# Altium footprint library WE Inductors.PcbLib: 131 footprints (part 7 of 9)
Each footprint in its own frame and in the unit in brackets; x right, y up, seen from the top. Pads: shape width x height; smd on the part's side, far side on the other; paste and mask are expansions set on the pad; w line width, h text height; cw(c..) or ccw(c..) is an arc to the next point about the centre after c.
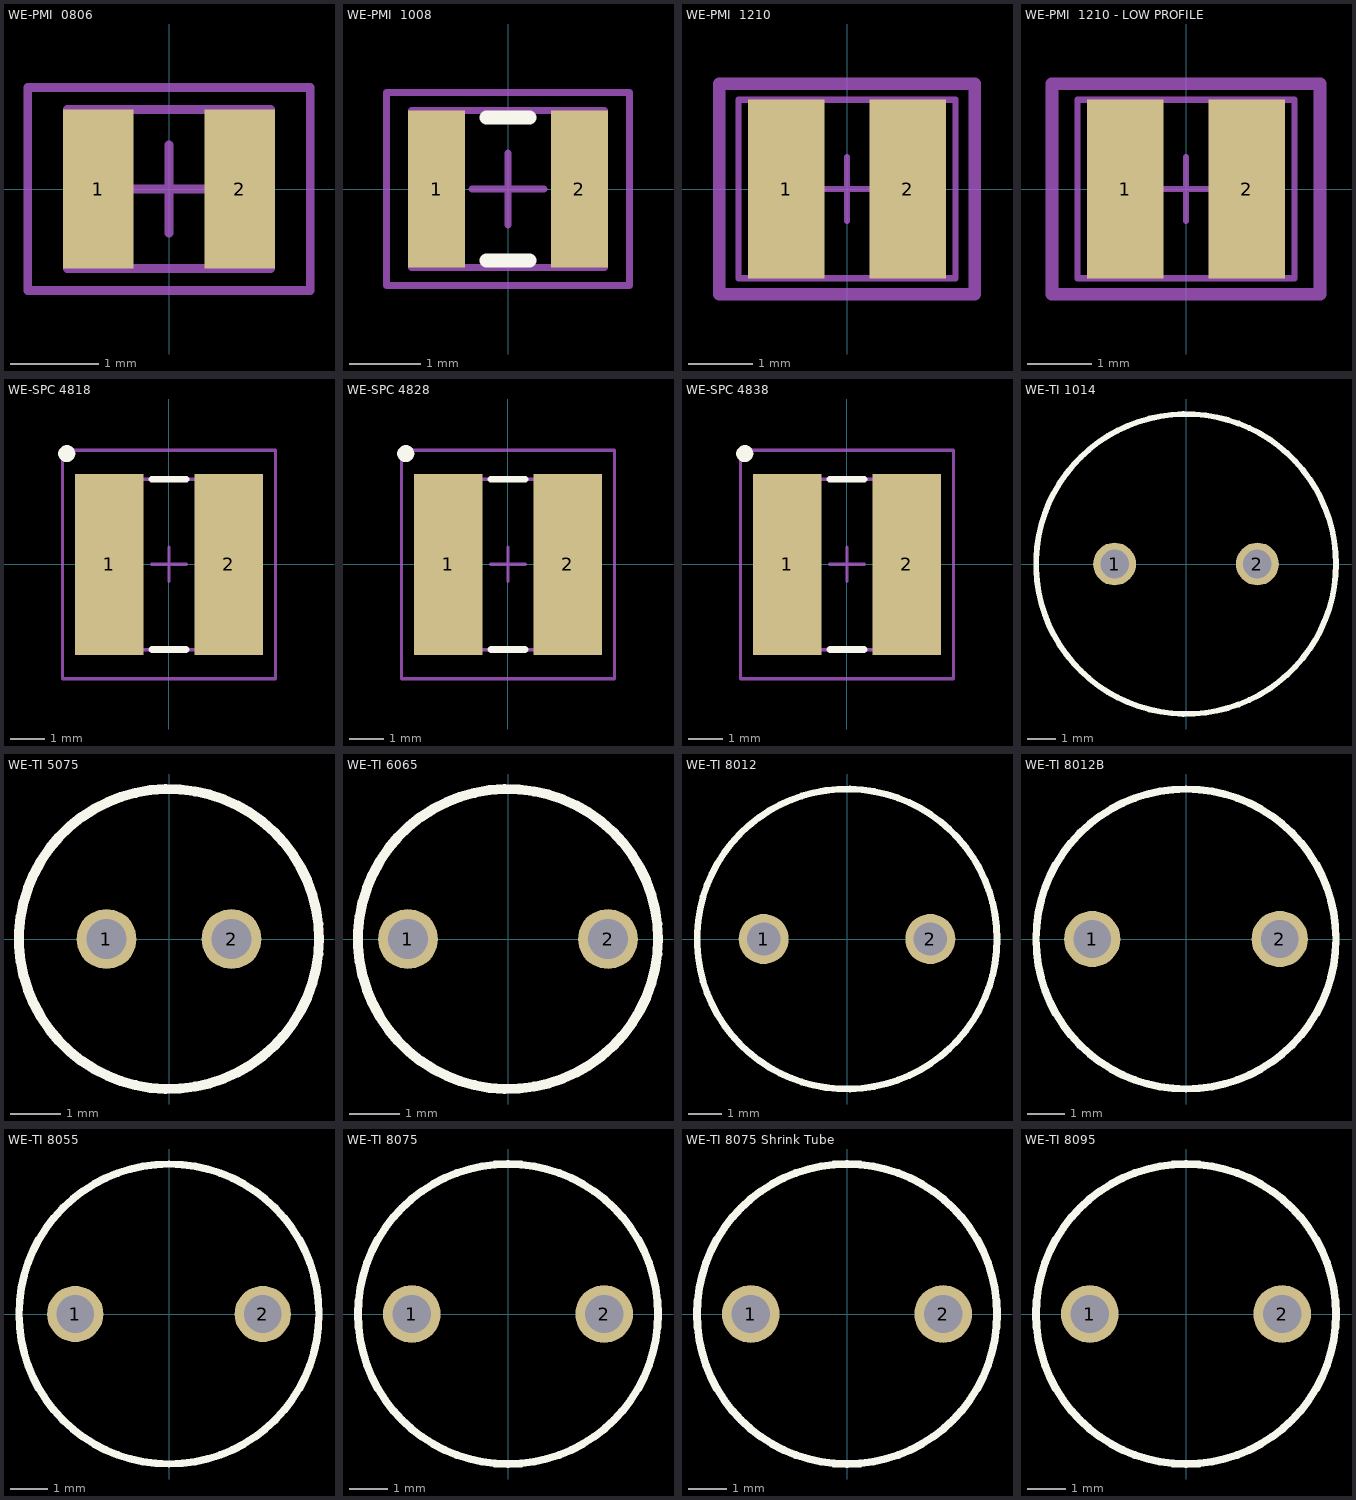
[diagram p6: the footprints below, top view; thin cyan lines are the x and y axes]

## WE-PMI  0806 [mm] "Chip Inductor, 2-Leads, Body 2.1x1.6mm, IPC Medium Density"
height 1
pads (2):
  rect 0.8x1.8 smd: 1(-0.8,0) 2(0.8,0)
Mechanical 13:
  lines w0.1: -1.15,-0.9 1.15,-0.9 1.15,0.9 -1.15,0.9 -1.15,-0.9
Mechanical 15:
  lines w0.1: -0.5,0 0.5,0 ; 0,-0.5 0,0.5 ; -1.6,-1.15 1.6,-1.15 1.6,1.15 -1.6,1.15 -1.6,-1.15
  text ".Designator" at 0,0 h0.76
3D body: height 1, standoff 0, extent -1,-0.8 1,0.8

## WE-PMI  1008 [mm] "Chip Inductor, 2-Leads, Body 2,5x2,0mm"
height 1
pads (2):
  rect 0.8x2.2 smd: 1(-1,0) 2(1,0)
Top Overlay:
  lines w0.2: -0.3,-1 0.3,-1 ; -0.3,1 0.3,1
Mechanical 13:
  lines w0.1: -1.35,-1.1 1.35,-1.1 1.35,1.1 -1.35,1.1 -1.35,-1.1
Mechanical 15:
  lines w0.1: -0.5,0 0.5,0 ; 0,-0.5 0,0.5 ; -1.7,-1.35 1.7,-1.35 1.7,1.35 -1.7,1.35 -1.7,-1.35
  text ".Designator" at 0,0 h0.76
3D body: height 0.89, standoff -0.01, extent -1.25,-1 1.25,1

## WE-PMI  1210 [mm] "Chip Inductor, 2-Leads, Body 3.20x2.50mm, IPC Medium Density"
height 1.2
pads (2):
  rect 1.2x2.8 smd: 1(-0.95,0) 2(0.95,0)
Mechanical 13:
  lines w0.1: -1.7,-1.4 1.7,-1.4 1.7,1.4 -1.7,1.4 -1.7,-1.4
Mechanical 15:
  lines w0.1: -0.5,0 0.5,0 ; 0,-0.5 0,0.5
  lines w0.2: -2,-1.65 -2,1.65 2,1.65 2,-1.65 -2,-1.65
  text ".Designator" at 0,0 h0.76
3D body: height 1.2, standoff 0, extent -1.6,-1.3 1.6,1.3

## WE-PMI  1210 - LOW PROFILE [mm] "Chip Inductor, 2-Leads, Body 3.20x2.50mm, IPC Medium Density"
height 0.7
pads (2):
  rect 1.2x2.8 smd: 1(-0.95,0) 2(0.95,0)
Mechanical 13:
  lines w0.1: -1.7,-1.4 -1.7,1.4 1.7,1.4 1.7,-1.4 -1.7,-1.4
Mechanical 15:
  lines w0.1: -0.5,0 0.5,0 ; 0,-0.5 0,0.5
  lines w0.2: -2.1,-1.65 2.1,-1.65 2.1,1.65 -2.1,1.65 -2.1,-1.65
  text ".Designator" at 0,0 h0.76
3D body: height 0.7, standoff 0, extent -1.6,-1.3 1.6,1.3

## WE-SPC 4818 [mm] "SMD Inductor, 2- pin, Body 4.80 x 4.80mm"
height 1.8
pads (2):
  rect 2x5.3 smd: 1(-1.75,0) 2(1.75,0)
Top Overlay:
  circle w0.25: c-3,3.25 r0.125
  lines w0.2: -0.5,-2.5 0.5,-2.5 ; -0.5,2.5 0.5,2.5
Mechanical 13:
  rectangle: -2.35,-2.5 -1.718,2.5
  lines w0.1: -2.35,-2.5 -2.35,2.5 2.35,2.5 2.35,-2.5 0.5,-2.5 -0.675,-2.5 -2.35,-2.5
Mechanical 15:
  lines w0.1: -0.5,0 0.5,0 ; 0,-0.5 0,0.5 ; -3.125,-3.35 3.125,-3.35 3.125,3.35 -3.125,3.35 -3.125,-3.35
3D body: height 1.8, standoff -0.01, extent -2.283,-2.537 2.537,2.283

## WE-SPC 4828 [mm] "SMD Inductor, 2- pin, Body 4.80 x 4.80mm"
height 2.8
pads (2):
  rect 2x5.3 smd: 1(-1.75,0) 2(1.75,0)
Top Overlay:
  circle w0.25: c-3,3.25 r0.125
  lines w0.2: -0.5,-2.5 0.5,-2.5 ; -0.5,2.5 0.5,2.5
Mechanical 13:
  rectangle: -2.35,-2.5 -1.718,2.5
  lines w0.1: -2.35,-2.5 -2.35,2.5 2.35,2.5 2.35,-2.5 -2.35,-2.5
Mechanical 15:
  lines w0.1: -0.5,0 0.5,0 ; 0,-0.5 0,0.5 ; -3.125,-3.35 -3.125,3.35 3.125,3.35 3.125,-3.35 -3.125,-3.35
3D body: height 2.8, standoff -0.01, extent -2.41,-2.41 2.41,2.41

## WE-SPC 4838 [mm] "SMD Inductor, 2- pin, Body 4.80 x 4.80mm"
height 3.8
pads (2):
  rect 2x5.3 smd: 1(-1.75,0) 2(1.75,0)
Top Overlay:
  circle w0.25: c-3,3.25 r0.125
  lines w0.2: -0.5,-2.5 0.5,-2.5 ; -0.5,2.5 0.5,2.5
Mechanical 13:
  rectangle: -2.35,-2.5 -1.718,2.5
  lines w0.1: -2.35,-2.5 2.35,-2.5 2.35,2.5 -2.35,2.5 -2.35,-2.5
Mechanical 15:
  lines w0.1: -0.5,0 0.5,0 ; 0,-0.5 0,0.5 ; -3.125,-3.35 3.125,-3.35 3.125,3.35 -3.125,3.35 -3.125,-3.35
3D body: height 3.8, standoff -0.01, extent -2.41,-2.41 2.41,2.41

## WE-TI 1014 [mm] "THT Inductor, 2-Leads, Body 10,0  mm"
height 14.5
pads (2):
  round 1.5 hole 1: 1(-2.5,0) 2(2.5,0)
Top Overlay:
  circle w0.2: c0,0 r5.25
Mechanical 1:
  circle w0.1: c0,0 r5.25
3D body: height 14.1, standoff -3.45, extent -4.983,-4.968 4.983,4.969

## WE-TI 5075 [mm] "THT Inductor, 2-Leads, Body 5.3  mm"
height 8.5
pads (2):
  round 1.2 hole 0.8: 1(-1.25,0) 2(1.25,0)
Top Overlay:
  circle w0.2: c0,0 r3
Mechanical 1:
  circle w0.1: c0,0 r3
3D body: height 7.6, standoff -3.5, extent -2.44,-2.44 2.44,2.45

## WE-TI 6065 [mm] "THT Inductor, 2-Leads, Body 6,0  mm"
height 6.5
pads (2):
  round 1.2 hole 0.8: 1(-2,0) 2(2,0)
Top Overlay:
  circle w0.2: c0,0 r3
Mechanical 1:
  circle w0.1: c0,0 r3
3D body: height 6.51, standoff -3.99, extent -3,-3 3,3

## WE-TI 8012 [mm] "THT Inductor, 2-Leads, Body 8,0  mm"
height 13.5
pads (2):
  round 1.5 hole 1: 1(-2.5,0) 2(2.5,0)
Top Overlay:
  circle w0.2: c0,0 r4.5
Mechanical 1:
  circle w0.1: c0,0 r4.5
3D body: height 13.5, standoff -3.5, extent -4.092,-4.068 4.092,4.1

## WE-TI 8012B [mm] "THT Inductor, 2-Leads, Body 8,0  mm"
height 12.5
pads (2):
  round 1.5 hole 1: 1(-2.5,0) 2(2.5,0)
Top Overlay:
  circle w0.2: c0,0 r4
Mechanical 1:
  circle w0.1: c0,0 r4
3D body: height 12.51, standoff -4.99, extent -3.965,-3.956 3.965,3.975

## WE-TI 8055 [mm] "THT Inductor, 2-Leads, Body 8,0  mm"
height 5.5
pads (2):
  round 1.5 hole 1: 1(-2.5,0) 2(2.5,0)
Top Overlay:
  circle w0.2: c0,0 r4
Mechanical 1:
  circle w0.1: c0,0 r4
3D body: height 5.5, standoff -5, extent -4.135,-4.134 4.145,4.146

## WE-TI 8075 [mm] "THT Inductor, 2-Leads, Body 7,8  mm"
height 7.5
pads (2):
  round 1.5 hole 1: 1(-2.5,0) 2(2.5,0)
Top Overlay:
  circle w0.2: c0,0 r3.9
Mechanical 1:
  circle w0.1: c0,0 r3.9
3D body: height 7.51, standoff -4.99, extent -3.888,-3.892 3.888,3.9

## WE-TI 8075 Shrink Tube [mm] "THT Inductor, 2-Leads, Body 7,8  mm"
height 8
pads (2):
  round 1.5 hole 1: 1(-2.5,0) 2(2.5,0)
Top Overlay:
  circle w0.2: c0,0 r3.9
Mechanical 1:
  circle w0.1: c0,0 r3.9
3D body: height 7.71, standoff -4.99, extent -4.082,-4.088 4.102,4.08

## WE-TI 8095 [mm] "THT Inductor, 2-Leads, Body 7,8  mm"
height 9.5
pads (2):
  round 1.5 hole 1: 1(-2.5,0) 2(2.5,0)
Top Overlay:
  circle w0.2: c0,0 r3.9
Mechanical 1:
  circle w0.1: c0,0 r3.9
3D body: height 9.5, standoff -5, extent -3.9,-3.9 3.886,3.895